# Altium footprint library 集大电协1.2.PcbLib: 175 footprints (part 7 of 11)
Each footprint in its own frame and in the unit in brackets; x right, y up, seen from the top. Pads: shape width x height; smd on the part's side, far side on the other; paste and mask are expansions set on the pad; w line width, h text height; cw(c..) or ccw(c..) is an arc to the next point about the centre after c.
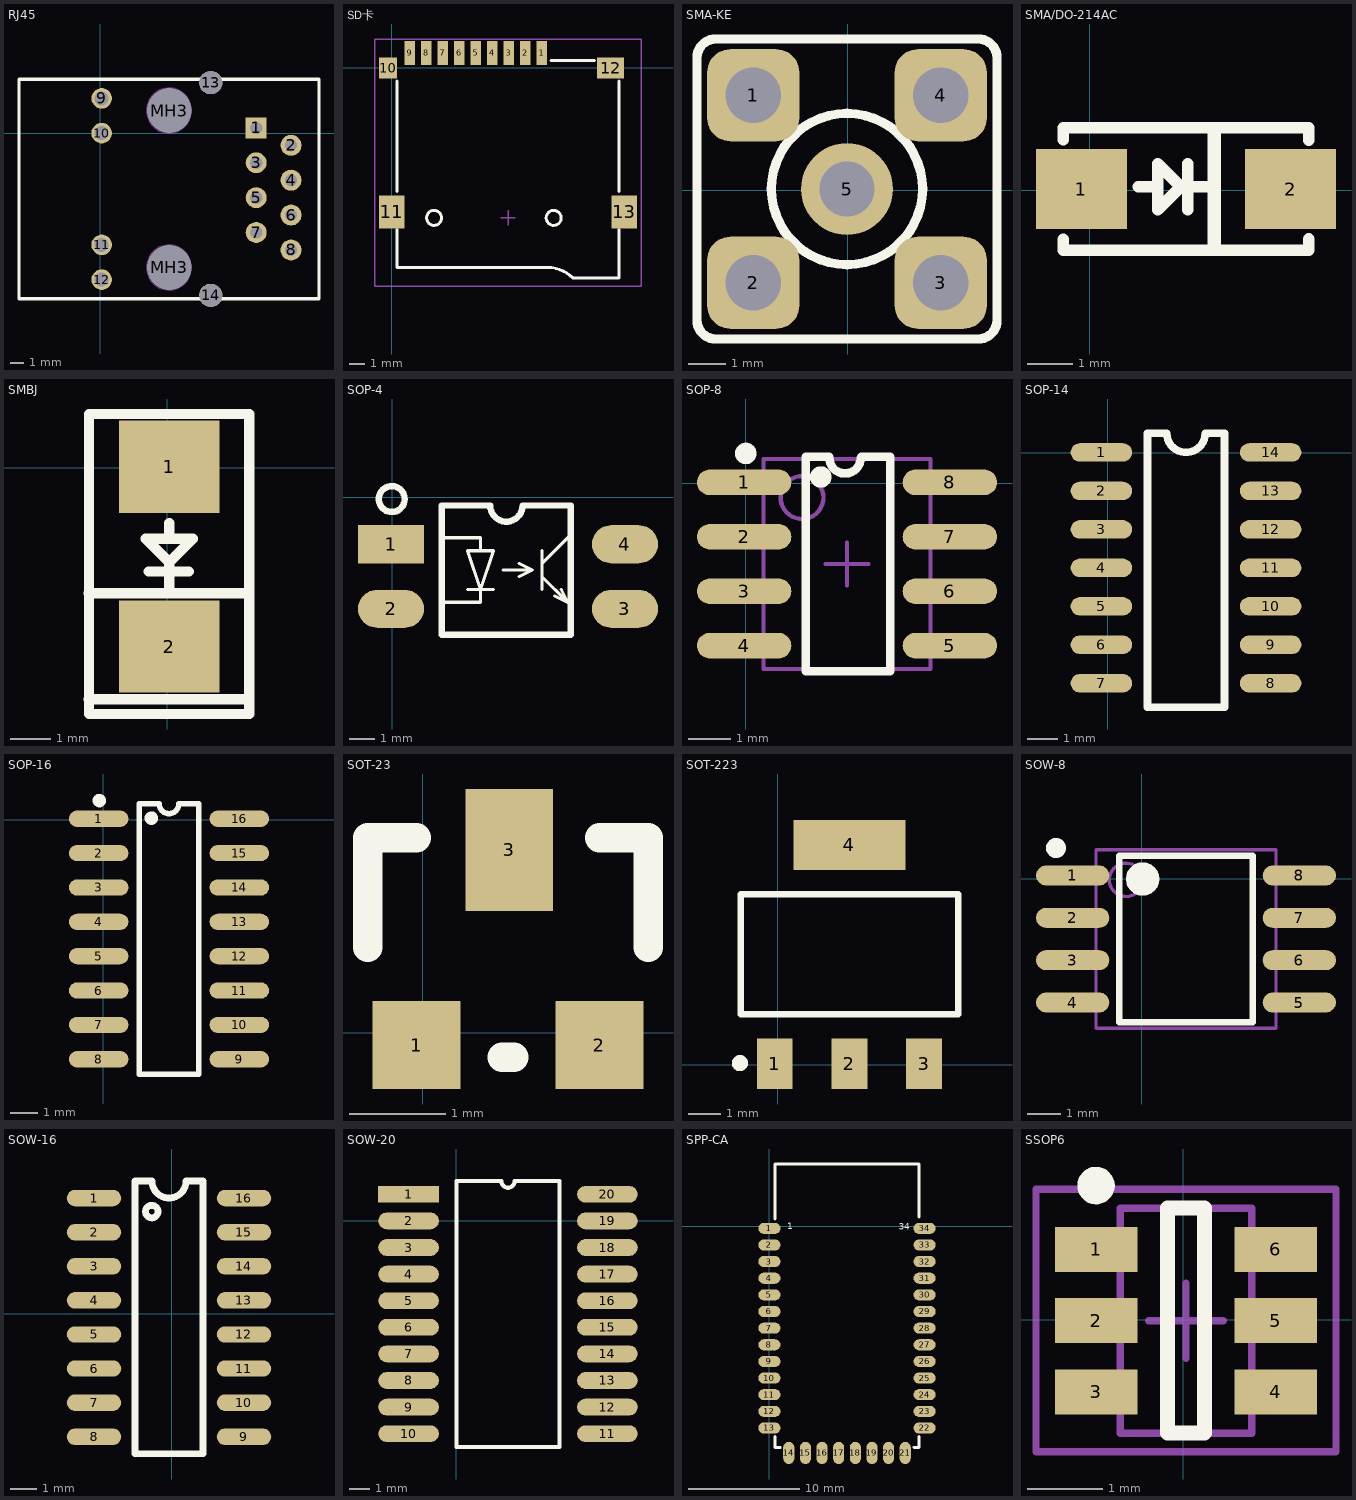
[diagram p6: the footprints below, top view; thin cyan lines are the x and y axes]

## RJ45 [mm]
pads (16):
  rect 1.524x1.524 hole 0.889: 1(11.347,0.398)
  round 1.524 hole 0.889: 2(13.887,-0.872) 3(11.347,-2.142) 4(13.887,-3.412) 5(11.347,-4.682) 6(13.887,-5.952) 7(11.347,-7.222) 8(13.887,-8.492)
  round 1.5 hole 1.02: 9(0.097,2.548) 10(0.097,0.012) 11(0.097,-8.116) 12(0.097,-10.652)
  round 1.7 hole 1.65: 13(8.045,3.698) 14(8.045,-11.802)
  round 2.95 hole 3.25: MH3(5.01,-9.768) MH3(5.01,1.662)
Top Overlay:
  lines w0.254: -5.925,-12.052 15.919,-12.052 15.919,-4.052 15.919,3.948 -5.925,3.948 -5.925,-4.052 -5.925,-12.052
Keep-Out Layer:
  circle w0.051: c4.997,1.664 r1.65
  circle w0.051: c4.997,-9.766 r1.65
Multi-Layer:
  circle w0.127: c5.01,-9.768 r1.798
  circle w0.127: c5.01,1.662 r1.798
3D body "RJ45 HanRun网口3D封装.STEP": height 14, standoff -2.5, extent -5.825,-12.075 15.575,3.805

## SD卡 [mm]
pads (13):
  rect 0.7x1.6 smd: 1(10.022,1) 2(8.922,1) 3(7.822,1) 4(6.722,1) 5(5.622,1) 6(4.522,1) 7(3.422,1) 8(2.322,1) 9(1.222,1)
  rect 1.2x1.4 smd: 10(-0.232,-0.008)
  rect 1.7x2.2 smd: 11(0.022,-9.608) 13(15.522,-9.608)
  rect 1.8x1.4 smd: 12(14.622,-0.008)
Top Overlay:
  circle w0.2: c10.822,-10.008 r0.5
  circle w0.2: c2.842,-10.008 r0.5
  lines w0.2: 0.372,-10.77 0.372,-13.308 8.788,-13.308 ; 0.372,-8.23 0.372,-0.864 ; 8.534,-13.308 10.4,-13.308 cw(c10.4,-15.698) 12.09,-14.008 15.172,-14.008 15.172,-10.77 ; 10.652,0.492 13.528,0.492 ; 15.172,-8.23 15.172,-0.864
Mechanical 15:
  lines w0.1: 7.272,-10.008 8.272,-10.008 ; 7.772,-10.508 7.772,-9.508 ; -1.118,-14.58 -1.118,1.93 16.662,1.93 16.662,-14.58 -1.118,-14.58
3D body "tf_card_1.stp": height 2.15, standoff -0.3, extent -0.277,-16.27 15.823,1.029

## SMA-KE [mm] "天线接头"
pads (5):
  rrect50% 2.5x2.5 hole 1.5: 1(-2.557,2.57) 2(-2.557,-2.51) 3(2.523,-2.51) 4(2.523,2.57)
  round 2.5 hole 1.5: 5(-0.017,0.03)
Top Overlay:
  circle w0.254: c-0.017,0.03 r2.048
  lines w0.2: 4.047,-3.526 4.047,-3.526 ; 4.047,-3.526 4.047,-3.526
  lines w0.254: 3.539,4.094 cw(c3.539,3.586) 4.047,3.586 4.047,-3.526 cw(c3.539,-3.526) 3.539,-4.034 -3.573,-4.034 cw(c-3.573,-3.526) -4.081,-3.526 -4.081,3.586 cw(c-3.573,3.586) -3.573,4.094 3.539,4.094 ; 3.539,4.094 3.539,4.094
3D body "User Library-SMA_Stehend_Amp 132134RP-1.STEP": height 9.53, standoff -3.94, extent -3.517,-3.47 3.483,3.53

## SMA/DO-214AC [mm]
pads (2):
  rect 2x1.75 smd: 1(-0.178,0.025) 2(4.422,0.025)
Top Overlay:
  lines w0.254: -0.578,-1.08 -0.578,-1.325 4.822,-1.325 4.822,-1.075 ; -0.578,1.105 -0.578,1.375 4.817,1.375 ; 1.067,0.076 1.397,0.076 ; 2.159,-0.432 2.159,0.584 ; 2.159,0.076 2.667,0.076 ; 4.822,1.1 4.822,1.375 ; 1.499,-0.432 1.499,0.584 2.007,0.076 1.499,-0.432
  lines w0.3: 2.742,-1.275 2.742,1.325
3D body "User Library-S1G.STEP": height 2.12, standoff -0.02, extent -0.376,-1.317 4.73,1.35

## SMBJ [mil] "TVS瞬态抑制二极管"
pads (2):
  rect 98x90 smd: 1(1.65,0.6) 2(1.65,-174.4)
Top Overlay:
  lines w10: -76.68,-225.78 79.32,-225.78 ; -76.68,-122.44 79.32,-122.44 ; -18.35,-101.4 20.65,-101.4 ; 1.65,-118.4 1.65,-93.4 ; 1.65,-69.4 1.65,-54.4 ; -76.35,-240.16 -76.35,52.17 79.65,52.17 79.65,-240.16 -76.35,-240.16 ; -21.35,-69.4 1.65,-92.4 24.65,-69.4 -21.35,-69.4
3D body "User Library-S1G.STEP": height 83.34, standoff -0.66, extent -49.88,-195.97 55.12,5.03

## SOP-4 [mm]
pads (4):
  rect 2.6x1.5 smd: 1(-0.05,-1.846)
  oval 2.6x1.5 smd: 2(-0.05,-4.386) 3(9.15,-4.386) 4(9.15,-1.846)
Top Overlay:
  circle w0.254: c-0.022,-0.068 r0.508
  lines w0.127: 1.946,-4.132 3.47,-4.132 3.47,-3.624 ; 1.946,-1.592 3.47,-1.592 3.47,-2.1 ; 2.962,-3.624 3.978,-3.624 ; 4.359,-2.862 5.502,-2.862 ; 4.994,-3.116 5.502,-2.862 ; 4.994,-2.608 5.502,-2.862 ; 5.883,-3.624 5.883,-2.1 ; 5.883,-3.116 6.899,-4.132 ; 5.883,-2.608 6.899,-1.592 ; 6.391,-3.878 6.899,-4.132 ; 6.645,-3.624 6.899,-4.132 ; 3.47,-3.624 3.978,-2.1 2.962,-2.1 3.47,-3.624
  lines w0.254: 1.946,-5.402 7.026,-5.402 7.026,-0.322 5.121,-0.322 cw(c4.486,-0.322) 3.851,-0.322 1.946,-0.322 1.946,-5.402
3D body "User Library-SOP254P665X290.STEP": height 2.9, standoff 0, extent 1.164,-5.4 7.85,-0.45

## SOP-8 [mm]
pads (8):
  oval 2.2x0.6 smd: 1(-0.038,0.025) 2(-0.038,-1.245) 3(-0.038,-2.515) 4(-0.038,-3.785) 5(4.762,-3.785) 6(4.762,-2.515) 7(4.762,-1.245) 8(4.762,0.025)
Top Overlay:
  circle w0.25: c1.75,0.15 r0.125
  circle w0.25: c0,0.7 r0.125
  lines w0.2: 1.95,0.6 ccw(c2.317,0.6) 2.683,0.6 ; 1.95,0.62 1.4,0.62 1.4,-4.38 3.375,-4.38 3.375,0.62 2.7,0.62
Mechanical 13:
  circle w0.1: c1.312,-0.33 r0.5
  lines w0.1: 0.412,-4.33 0.412,0.57 4.312,0.57 4.312,-4.33 0.412,-4.33
Mechanical 15:
  lines w0.1: 1.862,-1.88 2.862,-1.88 ; 2.362,-2.38 2.362,-1.38
3D body "SOP-8.STEP": height 1.7, standoff 0, extent -0.625,-4.325 5.375,0.575

## SOP-14 [mil]
pads (14):
  oval 80x24 smd: 1(-8.54,0.68) 2(-8.54,-49.32) 3(-8.54,-99.32) 4(-8.54,-149.32) 5(-8.54,-199.32) 6(-8.54,-249.32) 7(-8.54,-299.32) 8(211.46,-299.32) 9(211.46,-249.32) 10(211.46,-199.32) 11(211.46,-149.32) 12(211.46,-99.32) 13(211.46,-49.32) 14(211.46,0.68)
Top Overlay:
  lines w10: 51.46,-330.71 51.46,25.68 76.46,25.68 ccw(c101.46,25.68) 126.46,25.68 151.46,25.68 151.46,-330.71 51.46,-330.71
3D body "User Library-SOP14-p127-780.STEP": height 43.31, standoff 0, extent -43.31,-349.41 244.09,52.16

## SOP-16 [mm]
pads (16):
  oval 2.2x0.6 smd: 1(-0.174,0.028) 2(-0.174,-1.242) 3(-0.174,-2.512) 4(-0.174,-3.782) 5(-0.174,-5.052) 6(-0.174,-6.322) 7(-0.174,-7.592) 8(-0.174,-8.862) 9(5.026,-8.862) 10(5.026,-7.592) 11(5.026,-6.322) 12(5.026,-5.052) 13(5.026,-3.782) 14(5.026,-2.512) 15(5.026,-1.242) 16(5.026,0.028)
Top Overlay:
  circle w0.25: c-0.15,0.7 r0.125
  circle w0.25: c1.775,0.05 r0.125
  lines w0.2: 1.326,-9.417 3.526,-9.417 3.526,0.583 2.793,0.583 cw(c2.426,0.583) 2.059,0.583 1.326,0.583 1.326,-9.417
3D body "SOP-16.STEP": height 1.4, standoff 0, extent -0.45,-9.4 5.55,0.5

## SOT-23 [mil]
pads (3):
  rect 36x36 smd: 1(-2.52,-5.16) 2(72.48,-5.16)
  rect 36x50 smd: 3(35.48,74.84)
Top Overlay:
  lines w12: -22.52,34.84 -22.52,79.84 -2.52,79.84 ; 32.48,-10.16 37.48,-10.16 ; 72.48,79.84 92.48,79.84 92.48,34.84
3D body "SOT-23-3.STEP": height 47.24, standoff 0, extent -22.08,-18.11 92.09,92.12

## SOT-223 [mm]
pads (4):
  rect 1.1x1.55 smd: 1(-0.09,0.029) 2(2.21,0.029) 3(4.51,0.029)
  rect 3.45x1.55 smd: 4(2.21,6.779)
Top Overlay:
  circle w0.25: c-1.166,0.051 r0.125
  lines w0.2: -1.14,1.554 -1.14,5.254 5.56,5.254 5.56,1.554 -1.14,1.554
3D body: height 0.8, standoff 0, extent -1.092,1.372 5.512,5.563
3D body: height 0.3, standoff 0, extent 0.559,5.563 3.861,6.833
3D body: height 0.3, standoff 0, extent -0.584,-0.533 0.305,1.372
3D body: height 0.3, standoff 0, extent 1.702,-0.533 2.591,1.372
3D body: height 0.3, standoff 0, extent 4.115,-0.533 5.004,1.372

## SOW-8 [mm]
pads (8):
  oval 2.2x0.6 smd: 1(-2.078,0.092) 2(-2.078,-1.178) 3(-2.078,-2.448) 4(-2.078,-3.718) 5(4.722,-3.718) 6(4.722,-2.448) 7(4.722,-1.178) 8(4.722,0.092)
Top Overlay:
  circle w0.3: c-2.578,0.917 r0.15
  circle w0.5: c0.022,-0.013 r0.25
  lines w0.2: -0.678,-4.313 3.322,-4.313 3.322,0.687 -0.678,0.687 -0.678,-4.313
Mechanical 13:
  circle w0.1: c-0.478,-0.038 r0.5
  lines w0.1: -1.378,-4.488 4.022,-4.488 4.022,0.862 -1.378,0.862 -1.378,-4.488
3D body "User Library-sop-8.STEP": height 1.6, standoff 0, extent -1.724,-4.349 4.318,0.671

## SOW-16 [mil]
pads (16):
  oval 80x24 smd: 1(-113.69,169.78) 2(-113.69,119.78) 3(-113.69,69.78) 4(-113.69,19.78) 5(-113.69,-30.22) 6(-113.69,-80.22) 7(-113.69,-130.22) 8(-113.69,-180.22) 9(106.31,-180.22) 10(106.31,-130.22) 11(106.31,-80.22) 12(106.31,-30.22) 13(106.31,19.78) 14(106.31,69.78) 15(106.31,119.78) 16(106.31,169.78)
Top Overlay:
  circle w10: c-29,150 r9.22
  lines w10: -53.69,-205.22 46.31,-205.22 46.31,194.78 21.31,194.78 cw(c-3.69,194.78) -28.69,194.78 -53.69,194.78 -53.69,-205.22
3D body "SOP-16.STEP": height 55.12, standoff 0, extent -122.1,-199.88 114.12,189.89

## SOW-20 [mm]
pads (20):
  rect 2.9x0.8 smd: 1(-2.286,1.27)
  oval 2.9x0.8 smd: 2(-2.286,0) 3(-2.286,-1.27) 4(-2.286,-2.54) 5(-2.286,-3.81) 6(-2.286,-5.08) 7(-2.286,-6.35) 8(-2.286,-7.62) 9(-2.286,-8.89) 10(-2.286,-10.16) 11(7.214,-10.16) 12(7.214,-8.89) 13(7.214,-7.62) 14(7.214,-6.35) 15(7.214,-5.08) 16(7.214,-3.81) 17(7.214,-2.54) 18(7.214,-1.27) 19(7.214,0) 20(7.214,1.27)
Top Overlay:
  lines w0.2: -0.001,-10.795 -0.001,1.905 2.146,1.905 ccw(c2.464,1.905) 2.781,1.905 4.929,1.905 4.929,-10.795 -0.001,-10.795
3D body: height 2.54, standoff 0, extent -2.349,-10.477 7.493,1.715
3D body: height 2.67, standoff 2.54, extent -0.634,-0.635 0.635,0.635

## SPP-CA [mm]
pads (34):
  oval 2x1 smd: 1(0.013,-0.174) 2(0.013,-1.674) 3(0.013,-3.174) 4(0.013,-4.674) 5(0.013,-6.174) 6(0.013,-7.674) 7(0.013,-9.174) 8(0.013,-10.674) 9(0.013,-12.174) 10(0.013,-13.674) 11(0.013,-15.174) 12(0.013,-16.674) 13(0.013,-18.174) 22(14.013,-18.174) 23(14.013,-16.674) 24(14.013,-15.174) 25(14.013,-13.674) 26(14.013,-12.174) 27(14.013,-10.674) 28(14.013,-9.174) 29(14.013,-7.674) 30(14.013,-6.174) 31(14.013,-4.674) 32(14.013,-3.174) 33(14.013,-1.674) 34(14.013,-0.174)
  oval 1x2 smd: 14(1.763,-20.424) 15(3.263,-20.424) 16(4.763,-20.424) 17(6.263,-20.424) 18(7.763,-20.424) 19(9.263,-20.424) 20(10.763,-20.424) 21(12.263,-20.424)
Top Overlay:
  lines w0.254: 0.513,0.652 0.513,5.623 10.934,5.623 13.513,5.623 13.513,0.855 ; 0.52,-18.957 0.513,-18.964 0.513,-19.924 1.002,-19.924 ; 13.067,-19.922 13.069,-19.924 13.513,-19.924 ; 13.513,-19.897 13.513,-18.932
  text "1" at 1.637,-0.491 h1
  text "34" at 11.67,-0.542 h1

## SSOP6 [mm]
pads (6):
  rect 1.1x0.6 smd: 1(-1.166,0.942) 2(-1.166,-0.008) 3(-1.166,-0.958) 4(1.234,-0.958) 5(1.234,-0.008) 6(1.234,0.942)
Top Overlay:
  circle w0.25: c-1.166,1.792 r0.125
  lines w0.2: -0.216,-1.508 0.284,-1.508 0.284,1.492 -0.216,1.492 -0.216,-1.508
Mechanical 13:
  lines w0.1: -0.841,-1.508 -0.841,1.492 0.909,1.492 0.909,-1.508 -0.841,-1.508
Mechanical 15:
  lines w0.1: -0.466,-0.008 0.534,-0.008 ; 0.034,-0.508 0.034,0.492 ; -1.966,-1.758 -1.966,1.742 2.034,1.742 2.034,-1.758 -1.966,-1.758
3D body: height 1.45, standoff 0, extent -0.841,-1.508 0.909,1.492